# Altium footprint library mfmc_footprints.PcbLib: 156 footprints (part 4 of 10)
Each footprint in its own frame and in the unit in brackets; x right, y up, seen from the top. Pads: shape width x height; smd on the part's side, far side on the other; paste and mask are expansions set on the pad; w line width, h text height; cw(c..) or ccw(c..) is an arc to the next point about the centre after c.
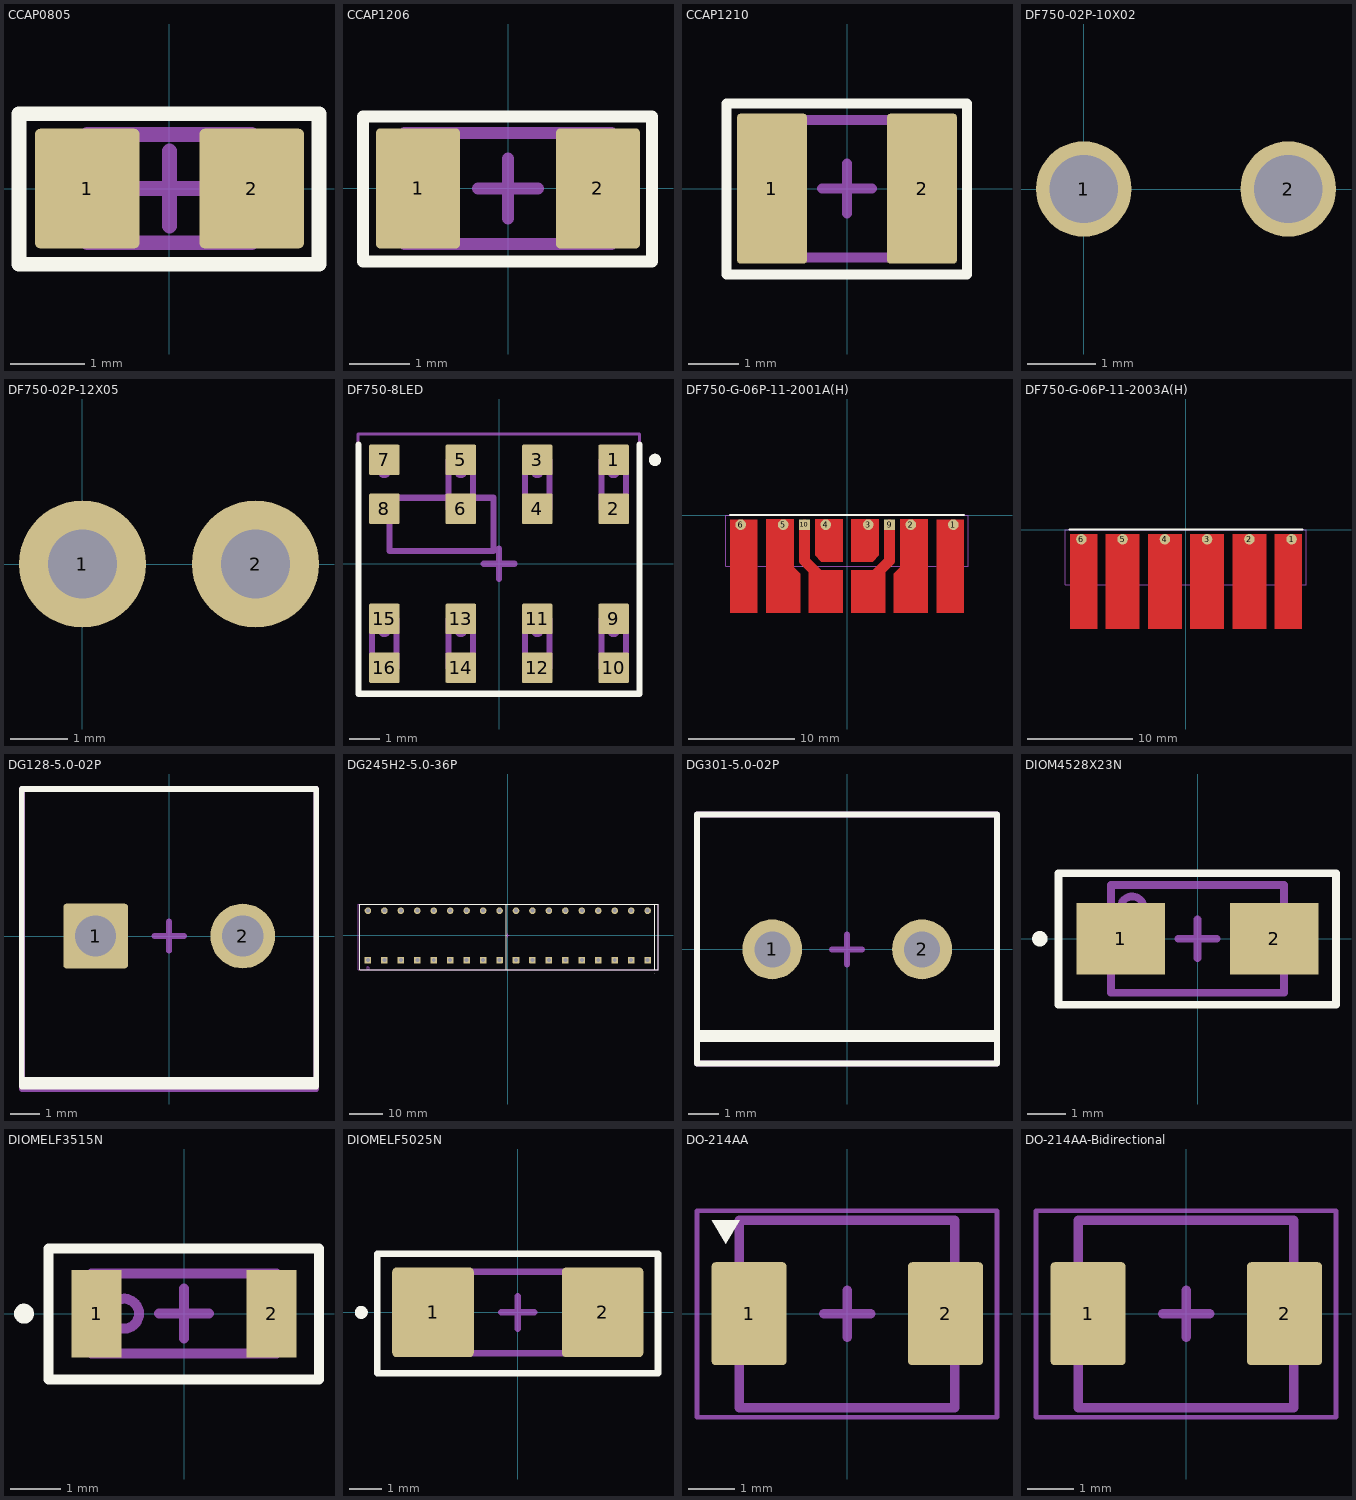
[diagram p3: the footprints below, top view; thin cyan lines are the x and y axes]

## CCAP0805 [mm] "Chip Capacitor, 2-Leads, Body 2,00x1,25mm, IPC Medium Density"
height 1.45
pads (2):
  rrect10% 1.4x1.6 smd: 1(-1.1,0) 2(1.1,0)
Top Overlay:
  lines w0.2: -2.013,-1.013 2,-1.013 2,1 -2.013,1 -2.013,-1.013
Top Courtyard:
  lines w0.1: -2,-1 2,-1 2,1 -2,1 -2,-1
  lines w0.2: -0.5,0 0.5,0 ; 0,-0.5 0,0.5
Top Assembly:
  lines w0.2: -1.1,-0.725 -1.1,0.725 1.1,0.725 1.1,-0.725 -1.1,-0.725
Top Designator (Mech10):
  text ".Designator" at -7.624,-0.514 h1.52
3D body "CAPC2012X14N.step": height 1.45, standoff 0, extent -1.1,-0.725 1.1,0.725

## CCAP1206 [mm] "Chip Capacitor, 2-Leads, Body 3,20x1,60mm, IPC Medium Density"
height 1.7
pads (2):
  rrect10% 1.4x2 smd: 1(-1.5,0) 2(1.5,0)
Top Overlay:
  lines w0.2: -2.419,-1.219 2.4,-1.219 2.4,1.2 -2.419,1.2 -2.419,-1.219
Top Courtyard:
  lines w0.1: -2.4,-1.2 2.4,-1.2 2.4,1.2 -2.4,1.2 -2.4,-1.2
  lines w0.2: -0.5,0 0.5,0 ; 0,-0.5 0,0.5
Top Assembly:
  lines w0.2: -1.725,-0.925 -1.725,0.925 1.725,0.925 1.725,-0.925 -1.725,-0.925
Top Designator (Mech10):
  text ".Designator" at -7.627,-0.517 h1.52
3D body "CAPC3216X17N.step": height 1.7, standoff 0, extent -1.725,-0.925 1.725,0.925

## CCAP1210 [mm] "Chip Capacitor, 2-Leads, Body 3,20x2,50mm, IPC Medium Density"
height 1.7
pads (2):
  rrect10% 1.4x3 smd: 1(-1.5,0) 2(1.5,0)
Top Overlay:
  lines w0.2: -2.413,-1.713 2.4,-1.713 2.4,1.7 -2.413,1.7 -2.413,-1.713
Top Courtyard:
  lines w0.1: -2.4,-1.7 -2.4,1.7 2.4,1.7 2.4,-1.7 -2.4,-1.7
  lines w0.2: -0.5,0 0.5,0 ; 0,-0.5 0,0.5
Top Assembly:
  lines w0.2: -1.725,-1.375 -1.725,1.375 1.725,1.375 1.725,-1.375 -1.725,-1.375
Top Designator (Mech10):
  text ".Designator" at -7.624,-0.514 h1.52
3D body "CAPC3225X17N.step": height 1.7, standoff 0, extent -1.725,-1.375 1.725,1.375

## DF750-02P-10X02 [mm] "Connector ground"
pads (2):
  round 1.4 hole 1: 1(0,0) 2(3,0)
Top Designator (Mech10):
  text ".Designator" at -6.118,-0.508 h1.52

## DF750-02P-12X05 [mm] "Connector ground"
pads (2):
  round 2.2 hole 1.2: 1(0,0) 2(3,0)
Top Designator (Mech10):
  text ".Designator" at -6.118,-0.508 h1.52

## DF750-8LED [mm]
pads (16):
  rrect10% 1x1 smd: 1(3.75,3.4) 2(3.75,1.8) 3(1.25,3.4) 4(1.25,1.8) 5(-1.25,3.4) 6(-1.25,1.8) 7(-3.75,3.4) 8(-3.75,1.8) 9(3.75,-1.8) 10(3.75,-3.4) 11(1.25,-1.8) 12(1.25,-3.4) 13(-1.25,-1.8) 14(-1.25,-3.4) 15(-3.75,-1.8) 16(-3.75,-3.4)
Top Overlay:
  circle w0.2: c5.1,3.4 r0.1
  lines w0.2: -4.6,3.9 -4.6,-4.25 4.6,-4.25 4.6,3.9
Top Courtyard:
  lines w0.1: -4.613,-4.263 4.6,-4.263 4.6,4.25 -4.613,4.25 -4.613,-4.263
  lines w0.2: -0.5,0 0.5,0 ; 0,-0.5 0,0.5
Top Assembly:
  circle w0.2: c-1.25,-2.2 r0.1
  circle w0.2: c1.25,-2.2 r0.1
  circle w0.2: c3.75,-2.2 r0.1
  circle w0.2: c-1.25,3 r0.1
  circle w0.2: c3.75,3 r0.1
  circle w0.2: c1.25,3 r0.1
  circle w0.2: c-3.75,-2.2 r0.1
  circle w0.2: c-3.75,3 r0.1
  lines w0.2: -4.15,-3.4 -4.15,-1.8 -3.35,-1.8 -3.35,-3.4 -4.15,-3.4 ; -3.588,0.425 -3.588,2.162 -0.175,2.162 -0.175,0.425 -3.588,0.425 ; -1.65,-3.4 -1.65,-1.8 -0.85,-1.8 -0.85,-3.4 -1.65,-3.4 ; -1.65,1.8 -1.65,3.4 -0.85,3.4 -0.85,1.8 -1.65,1.8 ; 0.85,-3.4 1.65,-3.4 1.65,-1.8 0.85,-1.8 0.85,-3.4 ; 0.85,1.8 1.65,1.8 1.65,3.4 0.85,3.4 0.85,1.8 ; 3.35,-3.4 4.15,-3.4 4.15,-1.8 3.35,-1.8 3.35,-3.4 ; 3.35,1.8 4.15,1.8 4.15,3.4 3.35,3.4 3.35,1.8
Top Designator (Mech10):
  text ".Designator" at -7.318,-0.533 h1.52
3D body "User Library-LED SMD0603.STEP": height 0.68, standoff 0, extent -4.118,1.775 -3.393,3.425
3D body "User Library-LED SMD0603.STEP": height 0.68, standoff 0, extent -1.618,1.775 -0.893,3.425
3D body "User Library-LED SMD0603.STEP": height 0.68, standoff 0, extent 0.882,1.775 1.607,3.425
3D body "User Library-LED SMD0603.STEP": height 0.68, standoff 0, extent 3.382,1.775 4.107,3.425
3D body "User Library-LED SMD0603.STEP": height 0.68, standoff 0, extent -4.118,-3.425 -3.393,-1.775
3D body "User Library-LED SMD0603.STEP": height 0.68, standoff 0, extent -1.618,-3.425 -0.893,-1.775
3D body "User Library-LED SMD0603.STEP": height 0.68, standoff 0, extent 0.882,-3.425 1.607,-1.775
3D body "User Library-LED SMD0603.STEP": height 0.68, standoff 0, extent 3.382,-3.425 4.107,-1.775

## DF750-G-06P-11-2001A(H) [mm] "Connector All Disconnected"
pads (8):
  round 1 smd: 1(10,-0.9) 2(6,-0.9) 3(2,-0.9) 4(-2,-0.9) 5(-6,-0.9) 6(-10,-0.9)
  rect 1x1 smd paste-2539.97 mask+0.102: 9(4,-0.9) 10(-4,-0.9)
Top Layer:
  region: -8.4,-9.2 -8.4,-0.4 -11,-0.4 -11,-9.2
  region: 11,-9.2 11,-0.4 8.4,-0.4 8.4,-9.2
  region: 7.6,-9.2 7.6,-0.4 5,-0.4 5,-4.9 4.4,-5.5 4.4,-9.2
  region: 3.6,-9.2 3.6,-5.2 0.4,-5.2 0.4,-9.2
  region: 3,-0.4 0.4,-0.4 0.4,-4.4 2.4,-4.4 3,-3.8
  region: -7.6,-9.2 -7.6,-0.4 -5,-0.4 -5,-4.9 -4.4,-5.5 -4.4,-9.2
  region: -3.6,-9.2 -3.6,-5.2 -0.4,-5.2 -0.4,-9.2
  region: -3,-0.4 -0.4,-0.4 -0.4,-4.4 -2.4,-4.4 -3,-3.8
  lines w1: -4,-0.9 -4,-4.293 -2.8,-5.493 -2.8,-6.3 ; 2.8,-6.3 2.8,-5.493 4,-4.293 4,-0.9
Top Overlay:
  lines w0.2: -11,0 11,0
Top Courtyard:
  lines w0.1: -11.413,-4.813 11.4,-4.813 11.4,0 -11.413,0 -11.413,-4.813
Top Designator (Mech10):
  text ".Designator" at -7.618,-8.458 h1.52
3D body "DF750-G-06P-11-01A(H).STEP": height 8.9, standoff -4.1, extent -16.3,-16 16.3,0

## DF750-G-06P-11-2003A(H) [mm] "Connector All Breackover"
pads (6):
  round 1 smd: 1(10,-0.9) 2(6,-0.9) 3(2,-0.9) 4(-2,-0.9) 5(-6,-0.9) 6(-9.9,-0.9)
Top Layer:
  region: -8.4,-9.4 -8.4,-0.4 -11,-0.4 -11,-9.4
  region: 11,-9.4 11,-0.4 8.4,-0.4 8.4,-9.4
  region: 7.6,-9.4 7.6,-0.4 4.4,-0.4 4.4,-9.4
  region: 3.6,-9.4 3.6,-0.4 0.4,-0.4 0.4,-9.4
  region: -0.4,-9.4 -0.4,-0.4 -3.6,-0.4 -3.6,-9.4
  region: -4.4,-9.4 -4.4,-0.4 -7.6,-0.4 -7.6,-9.4
Top Overlay:
  lines w0.2: -11,0 11,0
Top Courtyard:
  lines w0.1: -11.413,-5.213 11.4,-5.213 11.4,0 -11.413,0 -11.413,-5.213
Top Designator (Mech10):
  text ".Designator" at -7.618,-8.458 h1.52
3D body "DF750-G-06P-11-01A(H).STEP": height 8.9, standoff -4.1, extent -16.3,-16 16.3,0

## DG128-5.0-02P [mm]
height 14
pads (2):
  rrect10% 2.2x2.2 hole 1.4: 1(-2.5,0)
  round 2.2 hole 1.4: 2(2.5,0)
Top Overlay:
  rectangle: -5,-5.2 5,-4.8
  lines w0.2: -5.013,-5.113 5,-5.113 5,5 -5.013,5 -5.013,-5.113
Top Courtyard:
  lines w0.1: -5,-5.2 5,-5.2 5,5 -5,5 -5,-5.2
  lines w0.2: -0.5,0 0.5,0 ; 0,-0.5 0,0.5
Top Assembly:
  lines w0.2: -5,-5.2 5,-5.2 5,5 -5,5 -5,-5.2
Top Designator (Mech10):
  text ".Designator" at -7.853,-0.608 h1.52
3D body "DG128-5.0-02P-14-1000A(H).stp": height 14.01, standoff -3.49, extent -5.57,-5.2 5,5

## DG245H2-5.0-36P [mm]
height 26.5
pads (36):
  rrect10% 2x2 hole 1.2: 1(-42.5,-7.5) 3(-37.5,-7.5) 5(-32.5,-7.5) 7(-27.5,-7.5) 9(-22.5,-7.5) 11(-17.5,-7.5) 13(-12.5,-7.5) 15(-7.5,-7.5) 17(-2.5,-7.5) 19(2.5,-7.5) 21(7.5,-7.5) 23(12.5,-7.5) 25(17.5,-7.5) 27(22.5,-7.5) 29(27.5,-7.5) 31(32.5,-7.5) 33(37.5,-7.5) 35(42.5,-7.5)
  round 2 hole 1.2: 2(-42.5,7.5) 4(-37.5,7.5) 6(-32.5,7.5) 8(-27.5,7.5) 10(-22.5,7.5) 12(-17.5,7.5) 14(-12.5,7.5) 16(-7.5,7.5) 18(-2.5,7.5) 20(2.5,7.5) 22(7.5,7.5) 24(12.5,7.5) 26(17.5,7.5) 28(22.5,7.5) 30(27.5,7.5) 32(32.5,7.5) 34(37.5,7.5) 36(42.5,7.5)
Top Overlay:
  lines w0.2: -45.013,-10.513 44.65,-10.513 44.65,9.4 -45.013,9.4 -45.013,-10.513 ; -0.513,-10.513 45.65,-10.513 45.65,9.4 -0.513,9.4 -0.513,-10.513 ; 44.5,-11.6 ccw(c44.5,-11.6) 44.5,-11.6
Top Courtyard:
  lines w0.1: -45.513,-10.513 45.65,-10.513 45.65,9.4 -45.513,9.4 -45.513,-10.513
  lines w0.2: -0.5,0 0.5,0 ; 0,-0.5 0,0.5
Top Assembly:
  circle w0.2: c-42.5,-10.008 r0.4
  lines w0.2: -45.513,-10.513 45.65,-10.513 45.65,9.4 -45.513,9.4 -45.513,-10.513
Top Designator (Mech10):
  text ".Designator" at -7.549,-1.608 h1.52
3D body "DG245H2-5.0-36P-1Y-00A.STP": height 26.5, standoff -4, extent -45.35,-11.6 45.65,9.4

## DG301-5.0-02P [mm]
height 10
pads (2):
  round 2 hole 1.2: 1(-2.5,0) 2(2.5,0)
Top Overlay:
  rectangle: -5,-3.1 5,-2.7
  lines w0.2: -5.013,-3.813 5,-3.813 5,4.5 -5.013,4.5 -5.013,-3.813
Top Courtyard:
  lines w0.1: -5.013,-3.812 5,-3.812 5,4.5 -5.013,4.5 -5.013,-3.812
  lines w0.2: -0.5,0 0.5,0 ; 0,-0.5 0,0.5
Top Assembly:
  lines w0.2: -5.013,-3.813 5,-3.813 5,4.5 -5.013,4.5 -5.013,-3.813
Top Designator (Mech10):
  text ".Designator" at -7.867,-0.164 h1.52
3D body "DG301-5.0-02P-1Y-00A(H).stp": height 10, standoff -4.3, extent -5.6,-3.1 5,4.5

## DIOM4528X23N [mm] "Molded Diode, 2-Leads, Body 4,50x2,80mm, IPC Medium Density"
height 2.3
pads (2):
  rect 2.3x1.85 smd: 1(-2,0) 2(2,0)
Top Overlay:
  circle w0.2: c-4.1,0 r0.1
  lines w0.2: -3.613,-1.713 3.6,-1.713 3.6,1.7 -3.613,1.7 -3.613,-1.713
Top Courtyard:
  lines w0.1: -3.6,-1.7 -3.6,1.7 3.6,1.7 3.6,-1.7 -3.6,-1.7
  lines w0.2: -0.5,0 0.5,0 ; 0,-0.5 0,0.5
Top Assembly:
  circle w0.2: c-1.7,0.8 r0.3
  lines w0.2: -2.25,-1.4 -2.25,1.4 2.25,1.4 2.25,-1.4 -2.25,-1.4
Top Designator (Mech10):
  text ".Designator" at -7.918,-0.514 h1.52
3D body "DIOM4528X23N.step": height 2.3, standoff 0, extent -2.47,-1.4 2.47,1.4

## DIOMELF3515N [mm] "MELF Diode, 2-Leads, Body 3,50x1,53mm, IPC Medium Density"
height 1.6
pads (2):
  rect 1x1.75 smd: 1(-1.75,0) 2(1.75,0)
Top Overlay:
  circle w0.2: c-3.2,0 r0.1
  lines w0.2: -2.713,-1.313 2.7,-1.313 2.7,1.3 -2.713,1.3 -2.713,-1.313
Top Courtyard:
  lines w0.1: -2.713,-1.313 2.7,-1.313 2.7,1.3 -2.713,1.3 -2.713,-1.313
  lines w0.2: -0.5,0 0.5,0 ; 0,-0.5 0,0.5
Top Assembly:
  circle w0.2: c-1.2,0 r0.3
  lines w0.2: -1.85,-0.8 -1.85,0.8 1.85,0.8 1.85,-0.8 -1.85,-0.8
Top Designator (Mech10):
  text ".Designator" at -7.918,-0.514 h1.52
3D body "DIOMELF3515N.step": height 1.53, standoff 0.01, extent -1.75,-0.761 1.75,0.761

## DIOMELF5025N [mm] "MELF Diode, 2-Leads, Body 5,00x2,50mm, IPC Medium Density"
height 2.5
pads (2):
  rrect10% 2.5x2.75 smd: 1(-2.6,0) 2(2.6,0)
Top Overlay:
  circle w0.2: c-4.8,0 r0.1
  lines w0.2: -4.313,-1.863 4.3,-1.863 4.3,1.8 -4.313,1.8 -4.313,-1.863
Top Courtyard:
  lines w0.1: -4.3,-1.9 4.3,-1.9 4.3,1.8 -4.3,1.8 -4.3,-1.9
  lines w0.2: -0.5,0 0.5,0 ; 0,-0.5 0,0.5
Top Assembly:
  circle w0.2: c-1.8,0 r0.3
  lines w0.2: -2.5,-1.25 2.5,-1.25 2.5,1.25 -2.5,1.25 -2.5,-1.25
Top Designator (Mech10):
  text ".Designator" at -7.918,-0.539 h1.52
3D body "DIOMELF5025N.step": height 2.5, standoff 0.01, extent -2.5,-1.248 2.5,1.248

## DO-214AA [mm] "Surface Mount Package"
height 2.7
pads (2):
  rrect10% 1.6x2.2 smd: 1(-2.1,0) 2(2.1,0)
Top Overlay:
  region: -2.6,1.5 -2.9,2 -2.3,2
Top Courtyard:
  lines w0.1: -3.213,-2.213 3.2,-2.213 3.2,2.2 -3.213,2.2 -3.213,-2.213
  lines w0.2: -0.5,0 0.5,0 ; 0,-0.5 0,0.5
Top Assembly:
  lines w0.2: -2.313,-2.013 2.3,-2.013 2.3,2 -2.313,2 -2.313,-2.013
Top Designator (Mech10):
  text ".Designator" at -7.624,-0.514 h1.52
3D body "SMBJxx.STEP": height 2.7, standoff 0, extent -2.8,-2 2.8,2

## DO-214AA-Bidirectional [mm]
height 2.7
pads (2):
  rrect10% 1.6x2.2 smd: 1(-2.1,0) 2(2.1,0)
Top Courtyard:
  lines w0.1: -3.213,-2.213 3.2,-2.213 3.2,2.2 -3.213,2.2 -3.213,-2.213
  lines w0.2: -0.5,0 0.5,0 ; 0,-0.5 0,0.5
Top Assembly:
  lines w0.2: -2.313,-2.013 2.3,-2.013 2.3,2 -2.313,2 -2.313,-2.013
Top Designator (Mech10):
  text ".Designator" at -7.624,-0.514 h1.52
3D body "SMBJxx.STEP": height 2.7, standoff 0, extent -2.8,-2 2.8,2